# Altium schematic symbol library Linear Technology Comparators.SchLib: 630 symbols (part 4 of 16)
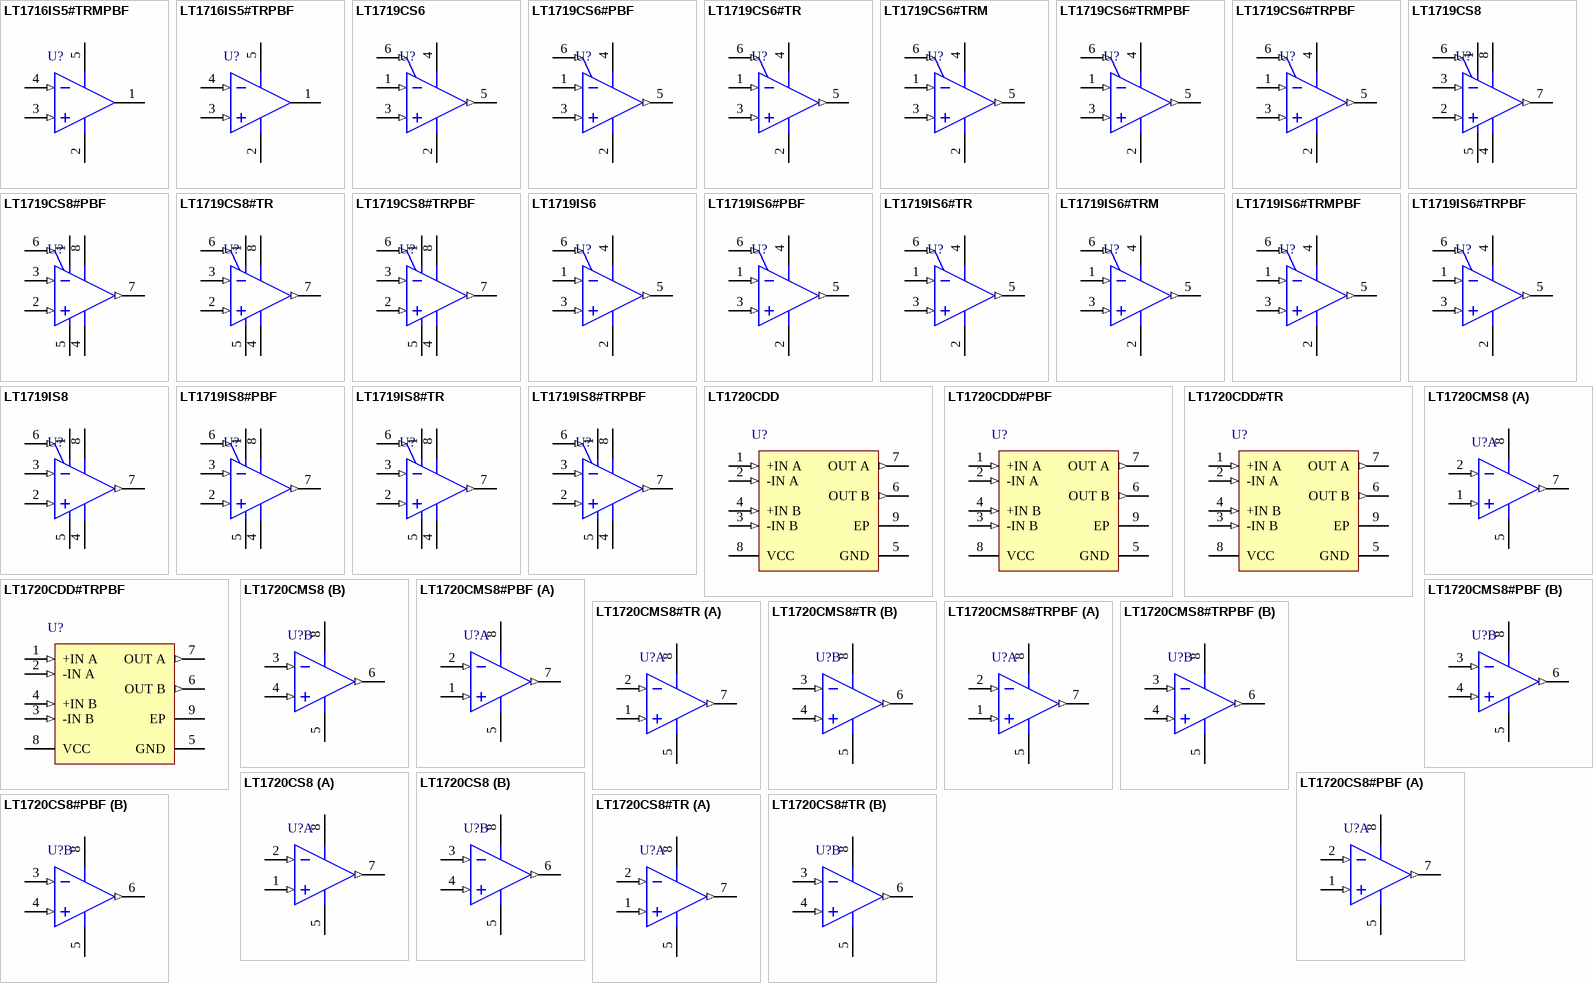
[diagram p27: symbols LT1716IS5#TRMPBF to LT1720CS8#TR]

## LT1720CMS8#TR
designator U?
4.5 ns, Single Supply 3 V / 5 V Comparator with Rail-to-Rail Outputs, 2 Channels, 2.7 to 6 V, 0 to +70 degC, 8-pin Plastic MSOP (MS8), Tape and Reel; Generic Part Number: LT1720; Manufacturer: Linear Technology; PartNumber: LT1720CMS8#TR; Channels (#): 2; Prop Delay (us): 0.0045; Supply Current (uA) Typical: 4000; Vos (mV) Guaranteed: 3; Vos (mV) Typical: 1; Vs Max (V): 6; Vs Min (V): 2.7; DatasheetVersion: Rev C; PackageReference: MS8; PackageDescription: 8-Pin Plastic MSOP, Body 3 x 3 mm, Pitch 0.65 mm; Supplier 1: Digi-Key; Supplier Part Number 1: LT1720CMS8#TR-ND; Features: Comparator, Rail-to-Rail Out; RoHS: N; Supply Voltage Range: 2.7 to 6 V; Mounting Technology: Surface Mount; ComponentLink1Description: Manufacturer URL; ComponentLink1URL: http://www.linear.com/; ComponentLink2Description: Datasheet; ComponentLink2URL: http://cds.linear.com/docs/en/datasheet/17201fc.pdf; ComponentLink3Description: Package Specification; ComponentLink3URL: http://cds.linear.com/docs/en/packaging/MSOP_8_05-08-1660.pdf
footprint LT-MS8_N (SOP, 8-Leads, Body 3x3mm, Pitch 0.65mm, IPC Medium Density)
footprint LT-MS8_L (SOP, 8-Leads, Body 3x3mm, Pitch 0.65mm, IPC High Density)
footprint LT-MS8_M (SOP, 8-Leads, Body 3x3mm, Pitch 0.65mm, IPC Low Density)
pins on every part: 5 GND (power), 8 VCC (power)
part A pins: 1 +INA (in), 2 -INA (in), 7 OUTA (out)
part B pins: 3 -INB (in), 4 +INB (in), 6 OUTB (out)

## LT1720CMS8#TRPBF
designator U?
4.5 ns, Single Supply 3 V / 5 V Comparator with Rail-to-Rail Outputs, 2 Channels, 2.7 to 6 V, 0 to +70 degC, 8-pin Plastic MSOP (MS8), Tape and Reel; Generic Part Number: LT1720; Manufacturer: Linear Technology; PartNumber: LT1720CMS8#TRPBF; Channels (#): 2; Prop Delay (us): 0.0045; Supply Current (uA) Typical: 4000; Vos (mV) Guaranteed: 3; Vos (mV) Typical: 1; Vs Max (V): 6; Vs Min (V): 2.7; DatasheetVersion: Rev C; PackageReference: MS8; PackageDescription: 8-Pin Plastic MSOP, Body 3 x 3 mm, Pitch 0.65 mm; Supplier 1: Digi-Key; Supplier Part Number 1: LT1720CMS8#TRPBF-ND; Features: Comparator, Rail-to-Rail Out; RoHS: Y; Supply Voltage Range: 2.7 to 6 V; Mounting Technology: Surface Mount; ComponentLink1Description: Manufacturer URL; ComponentLink1URL: http://www.linear.com/; ComponentLink2Description: Datasheet; ComponentLink2URL: http://cds.linear.com/docs/en/datasheet/17201fc.pdf; ComponentLink3Description: Package Specification; ComponentLink3URL: http://cds.linear.com/docs/en/packaging/MSOP_8_05-08-1660.pdf
footprint LT-MS8_N (SOP, 8-Leads, Body 3x3mm, Pitch 0.65mm, IPC Medium Density)
footprint LT-MS8_L (SOP, 8-Leads, Body 3x3mm, Pitch 0.65mm, IPC High Density)
footprint LT-MS8_M (SOP, 8-Leads, Body 3x3mm, Pitch 0.65mm, IPC Low Density)
pins on every part: 5 GND (power), 8 VCC (power)
part A pins: 1 +INA (in), 2 -INA (in), 7 OUTA (out)
part B pins: 3 -INB (in), 4 +INB (in), 6 OUTB (out)

## LT1720CS8
designator U?
4.5 ns, Single Supply 3 V / 5 V Comparator with Rail-to-Rail Outputs, 2 Channels, 2.7 to 6 V, 0 to +70 degC, 8-pin SOP (S8); Generic Part Number: LT1720; Manufacturer: Linear Technology; PartNumber: LT1720CS8; Channels (#): 2; Prop Delay (us): 0.0045; Supply Current (uA) Typical: 4000; Vos (mV) Guaranteed: 3; Vos (mV) Typical: 1; Vs Max (V): 6; Vs Min (V): 2.7; DatasheetVersion: Rev C; PackageReference: S8; PackageDescription: 8-Pin Plastic Small Outline (Narrow .150 Inch), Body 4.9 x 3.9 mm, Pitch 1.27 mm; Supplier 1: Digi-Key; Supplier Part Number 1: LT1720CS8-ND; Supplier 2: Newark; Supplier Part Number 2: 57M5826; Features: Comparator, Rail-to-Rail Out; RoHS: N; Supply Voltage Range: 2.7 to 6 V; Mounting Technology: Surface Mount; ComponentLink1Description: Manufacturer URL; ComponentLink1URL: http://www.linear.com/; ComponentLink2Description: Datasheet; ComponentLink2URL: http://cds.linear.com/docs/en/datasheet/17201fc.pdf; ComponentLink3Description: Package Specification; ComponentLink3URL: http://cds.linear.com/docs/en/packaging/05081610_G_SO8.pdf
footprint LT-S8_N (SOP, 8-Leads, Body 4.9x3.9mm, Pitch 1.27mm, IPC Medium Density)
footprint LT-S8_L (SOP, 8-Leads, Body 4.9x3.9mm, Pitch 1.27mm, IPC High Density)
footprint LT-S8_M (SOP, 8-Leads, Body 4.9x3.9mm, Pitch 1.27mm, IPC Low Density)
pins on every part: 5 GND (power), 8 VCC (power)
part A pins: 1 +INA (in), 2 -INA (in), 7 OUTA (out)
part B pins: 3 -INB (in), 4 +INB (in), 6 OUTB (out)

## LT1720CS8#PBF
designator U?
4.5 ns, Single Supply 3 V / 5 V Comparator with Rail-to-Rail Outputs, 2 Channels, 2.7 to 6 V, 0 to +70 degC, 8-pin SOP (S8); Generic Part Number: LT1720; Manufacturer: Linear Technology; PartNumber: LT1720CS8#PBF; Channels (#): 2; Prop Delay (us): 0.0045; Supply Current (uA) Typical: 4000; Vos (mV) Guaranteed: 3; Vos (mV) Typical: 1; Vs Max (V): 6; Vs Min (V): 2.7; DatasheetVersion: Rev C; PackageReference: S8; PackageDescription: 8-Pin Plastic Small Outline (Narrow .150 Inch), Body 4.9 x 3.9 mm, Pitch 1.27 mm; Supplier 1: Digi-Key; Supplier Part Number 1: LT1720CS8#PBF-ND; Supplier 2: Farnell; Supplier Part Number 2: 1651907; Supplier 3: Newark; Supplier Part Number 3: 57M5827; Features: Comparator, Rail-to-Rail Out; RoHS: Y; Supply Voltage Range: 2.7 to 6 V; Mounting Technology: Surface Mount; ComponentLink1Description: Manufacturer URL; ComponentLink1URL: http://www.linear.com/; ComponentLink2Description: Datasheet; ComponentLink2URL: http://cds.linear.com/docs/en/datasheet/17201fc.pdf; ComponentLink3Description: Package Specification; ComponentLink3URL: http://cds.linear.com/docs/en/packaging/05081610_G_SO8.pdf
footprint LT-S8_N (SOP, 8-Leads, Body 4.9x3.9mm, Pitch 1.27mm, IPC Medium Density)
footprint LT-S8_L (SOP, 8-Leads, Body 4.9x3.9mm, Pitch 1.27mm, IPC High Density)
footprint LT-S8_M (SOP, 8-Leads, Body 4.9x3.9mm, Pitch 1.27mm, IPC Low Density)
pins on every part: 5 GND (power), 8 VCC (power)
part A pins: 1 +INA (in), 2 -INA (in), 7 OUTA (out)
part B pins: 3 -INB (in), 4 +INB (in), 6 OUTB (out)

## LT1720CS8#TR
designator U?
4.5 ns, Single Supply 3 V / 5 V Comparator with Rail-to-Rail Outputs, 2 Channels, 2.7 to 6 V, 0 to +70 degC, 8-pin SOP (S8), Tape and Reel; Generic Part Number: LT1720; Manufacturer: Linear Technology; PartNumber: LT1720CS8#TR; Channels (#): 2; Prop Delay (us): 0.0045; Supply Current (uA) Typical: 4000; Vos (mV) Guaranteed: 3; Vos (mV) Typical: 1; Vs Max (V): 6; Vs Min (V): 2.7; DatasheetVersion: Rev C; PackageReference: S8; PackageDescription: 8-Pin Plastic Small Outline (Narrow .150 Inch), Body 4.9 x 3.9 mm, Pitch 1.27 mm; Supplier 1: Digi-Key; Supplier Part Number 1: LT1720CS8#TR-ND; Features: Comparator, Rail-to-Rail Out; RoHS: N; Supply Voltage Range: 2.7 to 6 V; Mounting Technology: Surface Mount; ComponentLink1Description: Manufacturer URL; ComponentLink1URL: http://www.linear.com/; ComponentLink2Description: Datasheet; ComponentLink2URL: http://cds.linear.com/docs/en/datasheet/17201fc.pdf; ComponentLink3Description: Package Specification; ComponentLink3URL: http://cds.linear.com/docs/en/packaging/05081610_G_SO8.pdf
footprint LT-S8_N (SOP, 8-Leads, Body 4.9x3.9mm, Pitch 1.27mm, IPC Medium Density)
footprint LT-S8_L (SOP, 8-Leads, Body 4.9x3.9mm, Pitch 1.27mm, IPC High Density)
footprint LT-S8_M (SOP, 8-Leads, Body 4.9x3.9mm, Pitch 1.27mm, IPC Low Density)
pins on every part: 5 GND (power), 8 VCC (power)
part A pins: 1 +INA (in), 2 -INA (in), 7 OUTA (out)
part B pins: 3 -INB (in), 4 +INB (in), 6 OUTB (out)

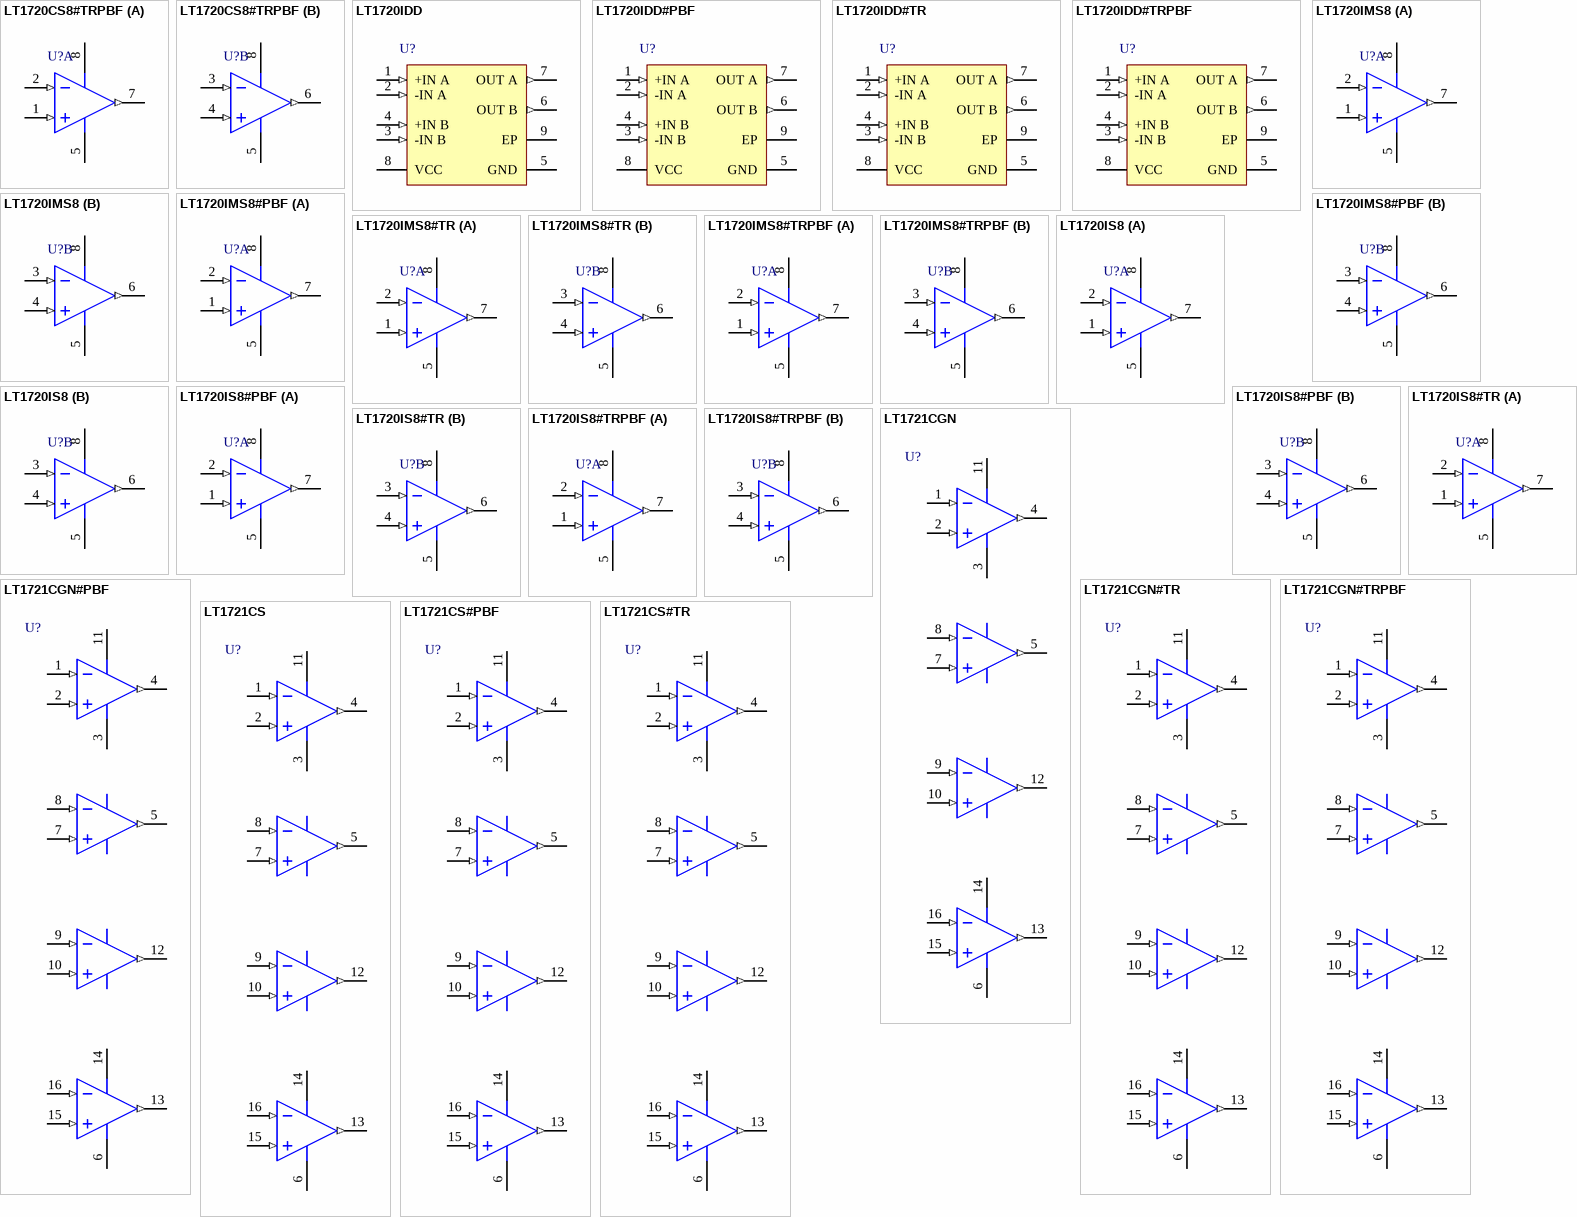
[diagram p7: symbols LT1720CS8#TRPBF to LT1721CS#TR]

## LT1720CS8#TRPBF
designator U?
4.5 ns, Single Supply 3 V / 5 V Comparator with Rail-to-Rail Outputs, 2 Channels, 2.7 to 6 V, 0 to +70 degC, 8-pin SOP (S8), Tape and Reel; Generic Part Number: LT1720; Manufacturer: Linear Technology; PartNumber: LT1720CS8#TRPBF; Channels (#): 2; Prop Delay (us): 0.0045; Supply Current (uA) Typical: 4000; Vos (mV) Guaranteed: 3; Vos (mV) Typical: 1; Vs Max (V): 6; Vs Min (V): 2.7; DatasheetVersion: Rev C; PackageReference: S8; PackageDescription: 8-Pin Plastic Small Outline (Narrow .150 Inch), Body 4.9 x 3.9 mm, Pitch 1.27 mm; Supplier 1: Digi-Key; Supplier Part Number 1: LT1720CS8#TRPBF-ND; Supplier 2: Newark; Supplier Part Number 2: 57M5829; Features: Comparator, Rail-to-Rail Out; RoHS: Y; Supply Voltage Range: 2.7 to 6 V; Mounting Technology: Surface Mount; ComponentLink1Description: Manufacturer URL; ComponentLink1URL: http://www.linear.com/; ComponentLink2Description: Datasheet; ComponentLink2URL: http://cds.linear.com/docs/en/datasheet/17201fc.pdf; ComponentLink3Description: Package Specification; ComponentLink3URL: http://cds.linear.com/docs/en/packaging/05081610_G_SO8.pdf
footprint LT-S8_N (SOP, 8-Leads, Body 4.9x3.9mm, Pitch 1.27mm, IPC Medium Density)
footprint LT-S8_L (SOP, 8-Leads, Body 4.9x3.9mm, Pitch 1.27mm, IPC High Density)
footprint LT-S8_M (SOP, 8-Leads, Body 4.9x3.9mm, Pitch 1.27mm, IPC Low Density)
pins on every part: 5 GND (power), 8 VCC (power)
part A pins: 1 +INA (in), 2 -INA (in), 7 OUTA (out)
part B pins: 3 -INB (in), 4 +INB (in), 6 OUTB (out)

## LT1720IDD
designator U?
4.5 ns, Single Supply 3 V / 5 V Comparator with Rail-to-Rail Outputs, 2 Channels, 2.7 to 6 V, -40 to +85 degC, 8-pin Plastic DFN (DD8); Generic Part Number: LT1720; Manufacturer: Linear Technology; PartNumber: LT1720IDD; Channels (#): 2; Prop Delay (us): 0.0045; Supply Current (uA) Typical: 4000; Vos (mV) Guaranteed: 3; Vos (mV) Typical: 1; Vs Max (V): 6; Vs Min (V): 2.7; DatasheetVersion: Rev C; PackageReference: DD8; PackageDescription: 8-Pin Plastic DFN, Body 3 × 3 mm, Pitch 0.5 mm; Supplier 1: Digi-Key; Supplier Part Number 1: LT1720IDD-ND; Features: Comparator, Rail-to-Rail Out; RoHS: N; Supply Voltage Range: 2.7 to 6 V; Mounting Technology: Surface Mount; Code_JEDEC: M0-229; ComponentLink1Description: Manufacturer URL; ComponentLink1URL: http://www.linear.com/; ComponentLink2Description: Datasheet; ComponentLink2URL: http://cds.linear.com/docs/en/datasheet/17201fc.pdf; ComponentLink3Description: Package Specification; ComponentLink3URL: http://cds.linear.com/docs/en/packaging/DFN_8_05-08-1698.pdf
footprint LT-DD8_V (SON, 8-Leads, Body 3x3mm, Pitch 0.5mm, Thermal Pad 2.38x1.65mm)
pins: 1 +IN A (in) "Noninverting Input of Comparator A.", 2 -IN A (in) "Inverting Input of Comparator A.", 3 -IN B (in) "Inverting Input of Comparator B.", 4 +IN B (in) "Noninverting Input of Comparator B.", 5 GND (power) "Ground.", 6 OUT B (out) "Output of Comparator B.", 7 OUT A (out) "Output of Comparator A.", 8 VCC (power) "Positive Supply Voltage.", 9 EP (power)

## LT1720IDD#PBF
designator U?
4.5 ns, Single Supply 3 V / 5 V Comparator with Rail-to-Rail Outputs, 2 Channels, 2.7 to 6 V, -40 to +85 degC, 8-pin Plastic DFN (DD8); Generic Part Number: LT1720; Manufacturer: Linear Technology; PartNumber: LT1720IDD#PBF; Channels (#): 2; Prop Delay (us): 0.0045; Supply Current (uA) Typical: 4000; Vos (mV) Guaranteed: 3; Vos (mV) Typical: 1; Vs Max (V): 6; Vs Min (V): 2.7; DatasheetVersion: Rev C; PackageReference: DD8; PackageDescription: 8-Pin Plastic DFN, Body 3 × 3 mm, Pitch 0.5 mm; Supplier 1: Digi-Key; Supplier Part Number 1: LT1720IDD#PBF-ND; Supplier 2: Farnell; Supplier Part Number 2: 2294778; Supplier 3: Newark; Supplier Part Number 3: 57M5831; Features: Comparator, Rail-to-Rail Out; RoHS: Y; Supply Voltage Range: 2.7 to 6 V; Mounting Technology: Surface Mount; Code_JEDEC: M0-229; ComponentLink1Description: Manufacturer URL; ComponentLink1URL: http://www.linear.com/; ComponentLink2Description: Datasheet; ComponentLink2URL: http://cds.linear.com/docs/en/datasheet/17201fc.pdf; ComponentLink3Description: Package Specification; ComponentLink3URL: http://cds.linear.com/docs/en/packaging/DFN_8_05-08-1698.pdf
footprint LT-DD8_V (SON, 8-Leads, Body 3x3mm, Pitch 0.5mm, Thermal Pad 2.38x1.65mm)
pins: 1 +IN A (in) "Noninverting Input of Comparator A.", 2 -IN A (in) "Inverting Input of Comparator A.", 3 -IN B (in) "Inverting Input of Comparator B.", 4 +IN B (in) "Noninverting Input of Comparator B.", 5 GND (power) "Ground.", 6 OUT B (out) "Output of Comparator B.", 7 OUT A (out) "Output of Comparator A.", 8 VCC (power) "Positive Supply Voltage.", 9 EP (power)

## LT1720IDD#TR
designator U?
4.5 ns, Single Supply 3 V / 5 V Comparator with Rail-to-Rail Outputs, 2 Channels, 2.7 to 6 V, -40 to +85 degC, 8-pin Plastic DFN (DD8), Tape and Reel; Generic Part Number: LT1720; Manufacturer: Linear Technology; PartNumber: LT1720IDD#TR; Channels (#): 2; Prop Delay (us): 0.0045; Supply Current (uA) Typical: 4000; Vos (mV) Guaranteed: 3; Vos (mV) Typical: 1; Vs Max (V): 6; Vs Min (V): 2.7; DatasheetVersion: Rev C; PackageReference: DD8; PackageDescription: 8-Pin Plastic DFN, Body 3 × 3 mm, Pitch 0.5 mm; Supplier 1: Digi-Key; Supplier Part Number 1: LT1720IDD#TR-ND; Features: Comparator, Rail-to-Rail Out; RoHS: N; Supply Voltage Range: 2.7 to 6 V; Mounting Technology: Surface Mount; Code_JEDEC: M0-229; ComponentLink1Description: Manufacturer URL; ComponentLink1URL: http://www.linear.com/; ComponentLink2Description: Datasheet; ComponentLink2URL: http://cds.linear.com/docs/en/datasheet/17201fc.pdf; ComponentLink3Description: Package Specification; ComponentLink3URL: http://cds.linear.com/docs/en/packaging/DFN_8_05-08-1698.pdf
footprint LT-DD8_V (SON, 8-Leads, Body 3x3mm, Pitch 0.5mm, Thermal Pad 2.38x1.65mm)
pins: 1 +IN A (in) "Noninverting Input of Comparator A.", 2 -IN A (in) "Inverting Input of Comparator A.", 3 -IN B (in) "Inverting Input of Comparator B.", 4 +IN B (in) "Noninverting Input of Comparator B.", 5 GND (power) "Ground.", 6 OUT B (out) "Output of Comparator B.", 7 OUT A (out) "Output of Comparator A.", 8 VCC (power) "Positive Supply Voltage.", 9 EP (power)

## LT1720IDD#TRPBF
designator U?
4.5 ns, Single Supply 3 V / 5 V Comparator with Rail-to-Rail Outputs, 2 Channels, 2.7 to 6 V, -40 to +85 degC, 8-pin Plastic DFN (DD8), Tape and Reel; Generic Part Number: LT1720; Manufacturer: Linear Technology; PartNumber: LT1720IDD#TRPBF; Channels (#): 2; Prop Delay (us): 0.0045; Supply Current (uA) Typical: 4000; Vos (mV) Guaranteed: 3; Vos (mV) Typical: 1; Vs Max (V): 6; Vs Min (V): 2.7; DatasheetVersion: Rev C; PackageReference: DD8; PackageDescription: 8-Pin Plastic DFN, Body 3 × 3 mm, Pitch 0.5 mm; Supplier 1: Digi-Key; Supplier Part Number 1: LT1720IDD#TRPBF-ND; Features: Comparator, Rail-to-Rail Out; RoHS: Y; Supply Voltage Range: 2.7 to 6 V; Mounting Technology: Surface Mount; Code_JEDEC: M0-229; ComponentLink1Description: Manufacturer URL; ComponentLink1URL: http://www.linear.com/; ComponentLink2Description: Datasheet; ComponentLink2URL: http://cds.linear.com/docs/en/datasheet/17201fc.pdf; ComponentLink3Description: Package Specification; ComponentLink3URL: http://cds.linear.com/docs/en/packaging/DFN_8_05-08-1698.pdf
footprint LT-DD8_V (SON, 8-Leads, Body 3x3mm, Pitch 0.5mm, Thermal Pad 2.38x1.65mm)
pins: 1 +IN A (in) "Noninverting Input of Comparator A.", 2 -IN A (in) "Inverting Input of Comparator A.", 3 -IN B (in) "Inverting Input of Comparator B.", 4 +IN B (in) "Noninverting Input of Comparator B.", 5 GND (power) "Ground.", 6 OUT B (out) "Output of Comparator B.", 7 OUT A (out) "Output of Comparator A.", 8 VCC (power) "Positive Supply Voltage.", 9 EP (power)

## LT1720IMS8
designator U?
4.5 ns, Single Supply 3 V / 5 V Comparator with Rail-to-Rail Outputs, 2 Channels, 2.7 to 6 V, -40 to +85 degC, 8-pin Plastic MSOP (MS8); Generic Part Number: LT1720; Manufacturer: Linear Technology; PartNumber: LT1720IMS8; Channels (#): 2; Prop Delay (us): 0.0045; Supply Current (uA) Typical: 4000; Vos (mV) Guaranteed: 3; Vos (mV) Typical: 1; Vs Max (V): 6; Vs Min (V): 2.7; DatasheetVersion: Rev C; PackageReference: MS8; PackageDescription: 8-Pin Plastic MSOP, Body 3 x 3 mm, Pitch 0.65 mm; Supplier 1: Digi-Key; Supplier Part Number 1: LT1720IMS8-ND; Features: Comparator, Rail-to-Rail Out; RoHS: N; Supply Voltage Range: 2.7 to 6 V; Mounting Technology: Surface Mount; ComponentLink1Description: Manufacturer URL; ComponentLink1URL: http://www.linear.com/; ComponentLink2Description: Datasheet; ComponentLink2URL: http://cds.linear.com/docs/en/datasheet/17201fc.pdf; ComponentLink3Description: Package Specification; ComponentLink3URL: http://cds.linear.com/docs/en/packaging/MSOP_8_05-08-1660.pdf
footprint LT-MS8_N (SOP, 8-Leads, Body 3x3mm, Pitch 0.65mm, IPC Medium Density)
footprint LT-MS8_L (SOP, 8-Leads, Body 3x3mm, Pitch 0.65mm, IPC High Density)
footprint LT-MS8_M (SOP, 8-Leads, Body 3x3mm, Pitch 0.65mm, IPC Low Density)
pins on every part: 5 GND (power), 8 VCC (power)
part A pins: 1 +INA (in), 2 -INA (in), 7 OUTA (out)
part B pins: 3 -INB (in), 4 +INB (in), 6 OUTB (out)

## LT1720IMS8#PBF
designator U?
4.5 ns, Single Supply 3 V / 5 V Comparator with Rail-to-Rail Outputs, 2 Channels, 2.7 to 6 V, -40 to +85 degC, 8-pin Plastic MSOP (MS8); Generic Part Number: LT1720; Manufacturer: Linear Technology; PartNumber: LT1720IMS8#PBF; Channels (#): 2; Prop Delay (us): 0.0045; Supply Current (uA) Typical: 4000; Vos (mV) Guaranteed: 3; Vos (mV) Typical: 1; Vs Max (V): 6; Vs Min (V): 2.7; DatasheetVersion: Rev C; PackageReference: MS8; PackageDescription: 8-Pin Plastic MSOP, Body 3 x 3 mm, Pitch 0.65 mm; Supplier 1: Digi-Key; Supplier Part Number 1: LT1720IMS8#PBF-ND; Supplier 2: Newark; Supplier Part Number 2: 57M5835; Features: Comparator, Rail-to-Rail Out; RoHS: Y; Supply Voltage Range: 2.7 to 6 V; Mounting Technology: Surface Mount; ComponentLink1Description: Manufacturer URL; ComponentLink1URL: http://www.linear.com/; ComponentLink2Description: Datasheet; ComponentLink2URL: http://cds.linear.com/docs/en/datasheet/17201fc.pdf; ComponentLink3Description: Package Specification; ComponentLink3URL: http://cds.linear.com/docs/en/packaging/MSOP_8_05-08-1660.pdf
footprint LT-MS8_N (SOP, 8-Leads, Body 3x3mm, Pitch 0.65mm, IPC Medium Density)
footprint LT-MS8_L (SOP, 8-Leads, Body 3x3mm, Pitch 0.65mm, IPC High Density)
footprint LT-MS8_M (SOP, 8-Leads, Body 3x3mm, Pitch 0.65mm, IPC Low Density)
pins on every part: 5 GND (power), 8 VCC (power)
part A pins: 1 +INA (in), 2 -INA (in), 7 OUTA (out)
part B pins: 3 -INB (in), 4 +INB (in), 6 OUTB (out)

## LT1720IMS8#TR
designator U?
4.5 ns, Single Supply 3 V / 5 V Comparator with Rail-to-Rail Outputs, 2 Channels, 2.7 to 6 V, -40 to +85 degC, 8-pin Plastic MSOP (MS8), Tape and Reel; Generic Part Number: LT1720; Manufacturer: Linear Technology; PartNumber: LT1720IMS8#TR; Channels (#): 2; Prop Delay (us): 0.0045; Supply Current (uA) Typical: 4000; Vos (mV) Guaranteed: 3; Vos (mV) Typical: 1; Vs Max (V): 6; Vs Min (V): 2.7; DatasheetVersion: Rev C; PackageReference: MS8; PackageDescription: 8-Pin Plastic MSOP, Body 3 x 3 mm, Pitch 0.65 mm; Supplier 1: Digi-Key; Supplier Part Number 1: LT1720IMS8#TR-ND; Features: Comparator, Rail-to-Rail Out; RoHS: N; Supply Voltage Range: 2.7 to 6 V; Mounting Technology: Surface Mount; ComponentLink1Description: Manufacturer URL; ComponentLink1URL: http://www.linear.com/; ComponentLink2Description: Datasheet; ComponentLink2URL: http://cds.linear.com/docs/en/datasheet/17201fc.pdf; ComponentLink3Description: Package Specification; ComponentLink3URL: http://cds.linear.com/docs/en/packaging/MSOP_8_05-08-1660.pdf
footprint LT-MS8_N (SOP, 8-Leads, Body 3x3mm, Pitch 0.65mm, IPC Medium Density)
footprint LT-MS8_L (SOP, 8-Leads, Body 3x3mm, Pitch 0.65mm, IPC High Density)
footprint LT-MS8_M (SOP, 8-Leads, Body 3x3mm, Pitch 0.65mm, IPC Low Density)
pins on every part: 5 GND (power), 8 VCC (power)
part A pins: 1 +INA (in), 2 -INA (in), 7 OUTA (out)
part B pins: 3 -INB (in), 4 +INB (in), 6 OUTB (out)

## LT1720IMS8#TRPBF
designator U?
4.5 ns, Single Supply 3 V / 5 V Comparator with Rail-to-Rail Outputs, 2 Channels, 2.7 to 6 V, -40 to +85 degC, 8-pin Plastic MSOP (MS8), Tape and Reel; Generic Part Number: LT1720; Manufacturer: Linear Technology; PartNumber: LT1720IMS8#TRPBF; Channels (#): 2; Prop Delay (us): 0.0045; Supply Current (uA) Typical: 4000; Vos (mV) Guaranteed: 3; Vos (mV) Typical: 1; Vs Max (V): 6; Vs Min (V): 2.7; DatasheetVersion: Rev C; PackageReference: MS8; PackageDescription: 8-Pin Plastic MSOP, Body 3 x 3 mm, Pitch 0.65 mm; Supplier 1: Digi-Key; Supplier Part Number 1: LT1720IMS8#TRPBF-ND; Supplier 2: Newark; Supplier Part Number 2: 57M5837; Features: Comparator, Rail-to-Rail Out; RoHS: Y; Supply Voltage Range: 2.7 to 6 V; Mounting Technology: Surface Mount; ComponentLink1Description: Manufacturer URL; ComponentLink1URL: http://www.linear.com/; ComponentLink2Description: Datasheet; ComponentLink2URL: http://cds.linear.com/docs/en/datasheet/17201fc.pdf; ComponentLink3Description: Package Specification; ComponentLink3URL: http://cds.linear.com/docs/en/packaging/MSOP_8_05-08-1660.pdf
footprint LT-MS8_N (SOP, 8-Leads, Body 3x3mm, Pitch 0.65mm, IPC Medium Density)
footprint LT-MS8_L (SOP, 8-Leads, Body 3x3mm, Pitch 0.65mm, IPC High Density)
footprint LT-MS8_M (SOP, 8-Leads, Body 3x3mm, Pitch 0.65mm, IPC Low Density)
pins on every part: 5 GND (power), 8 VCC (power)
part A pins: 1 +INA (in), 2 -INA (in), 7 OUTA (out)
part B pins: 3 -INB (in), 4 +INB (in), 6 OUTB (out)

## LT1720IS8
designator U?
4.5 ns, Single Supply 3 V / 5 V Comparator with Rail-to-Rail Outputs, 2 Channels, 2.7 to 6 V, -40 to +85 degC, 8-pin SOP (S8); Generic Part Number: LT1720; Manufacturer: Linear Technology; PartNumber: LT1720IS8; Channels (#): 2; Prop Delay (us): 0.0045; Supply Current (uA) Typical: 4000; Vos (mV) Guaranteed: 3; Vos (mV) Typical: 1; Vs Max (V): 6; Vs Min (V): 2.7; DatasheetVersion: Rev C; PackageReference: S8; PackageDescription: 8-Pin Plastic Small Outline (Narrow .150 Inch), Body 4.9 x 3.9 mm, Pitch 1.27 mm; Supplier 1: Digi-Key; Supplier Part Number 1: LT1720IS8-ND; Supplier 2: Newark; Supplier Part Number 2: 57M5838; Features: Comparator, Rail-to-Rail Out; RoHS: N; Supply Voltage Range: 2.7 to 6 V; Mounting Technology: Surface Mount; ComponentLink1Description: Manufacturer URL; ComponentLink1URL: http://www.linear.com/; ComponentLink2Description: Datasheet; ComponentLink2URL: http://cds.linear.com/docs/en/datasheet/17201fc.pdf; ComponentLink3Description: Package Specification; ComponentLink3URL: http://cds.linear.com/docs/en/packaging/05081610_G_SO8.pdf
footprint LT-S8_N (SOP, 8-Leads, Body 4.9x3.9mm, Pitch 1.27mm, IPC Medium Density)
footprint LT-S8_L (SOP, 8-Leads, Body 4.9x3.9mm, Pitch 1.27mm, IPC High Density)
footprint LT-S8_M (SOP, 8-Leads, Body 4.9x3.9mm, Pitch 1.27mm, IPC Low Density)
pins on every part: 5 GND (power), 8 VCC (power)
part A pins: 1 +INA (in), 2 -INA (in), 7 OUTA (out)
part B pins: 3 -INB (in), 4 +INB (in), 6 OUTB (out)

## LT1720IS8#PBF
designator U?
4.5 ns, Single Supply 3 V / 5 V Comparator with Rail-to-Rail Outputs, 2 Channels, 2.7 to 6 V, -40 to +85 degC, 8-pin SOP (S8); Generic Part Number: LT1720; Manufacturer: Linear Technology; PartNumber: LT1720IS8#PBF; Channels (#): 2; Prop Delay (us): 0.0045; Supply Current (uA) Typical: 4000; Vos (mV) Guaranteed: 3; Vos (mV) Typical: 1; Vs Max (V): 6; Vs Min (V): 2.7; DatasheetVersion: Rev C; PackageReference: S8; PackageDescription: 8-Pin Plastic Small Outline (Narrow .150 Inch), Body 4.9 x 3.9 mm, Pitch 1.27 mm; Supplier 1: Digi-Key; Supplier Part Number 1: LT1720IS8#PBF-ND; Supplier 2: Farnell; Supplier Part Number 2: 2254829; Supplier 3: Newark; Supplier Part Number 3: 57M5839; Features: Comparator, Rail-to-Rail Out; RoHS: Y; Supply Voltage Range: 2.7 to 6 V; Mounting Technology: Surface Mount; ComponentLink1Description: Manufacturer URL; ComponentLink1URL: http://www.linear.com/; ComponentLink2Description: Datasheet; ComponentLink2URL: http://cds.linear.com/docs/en/datasheet/17201fc.pdf; ComponentLink3Description: Package Specification; ComponentLink3URL: http://cds.linear.com/docs/en/packaging/05081610_G_SO8.pdf
footprint LT-S8_N (SOP, 8-Leads, Body 4.9x3.9mm, Pitch 1.27mm, IPC Medium Density)
footprint LT-S8_L (SOP, 8-Leads, Body 4.9x3.9mm, Pitch 1.27mm, IPC High Density)
footprint LT-S8_M (SOP, 8-Leads, Body 4.9x3.9mm, Pitch 1.27mm, IPC Low Density)
pins on every part: 5 GND (power), 8 VCC (power)
part A pins: 1 +INA (in), 2 -INA (in), 7 OUTA (out)
part B pins: 3 -INB (in), 4 +INB (in), 6 OUTB (out)

## LT1720IS8#TR
designator U?
4.5 ns, Single Supply 3 V / 5 V Comparator with Rail-to-Rail Outputs, 2 Channels, 2.7 to 6 V, -40 to +85 degC, 8-pin SOP (S8), Tape and Reel; Generic Part Number: LT1720; Manufacturer: Linear Technology; PartNumber: LT1720IS8#TR; Channels (#): 2; Prop Delay (us): 0.0045; Supply Current (uA) Typical: 4000; Vos (mV) Guaranteed: 3; Vos (mV) Typical: 1; Vs Max (V): 6; Vs Min (V): 2.7; DatasheetVersion: Rev C; PackageReference: S8; PackageDescription: 8-Pin Plastic Small Outline (Narrow .150 Inch), Body 4.9 x 3.9 mm, Pitch 1.27 mm; Supplier 1: Digi-Key; Supplier Part Number 1: LT1720IS8#TR-ND; Supplier 2: Newark; Supplier Part Number 2: 57M5840; Features: Comparator, Rail-to-Rail Out; RoHS: N; Supply Voltage Range: 2.7 to 6 V; Mounting Technology: Surface Mount; ComponentLink1Description: Manufacturer URL; ComponentLink1URL: http://www.linear.com/; ComponentLink2Description: Datasheet; ComponentLink2URL: http://cds.linear.com/docs/en/datasheet/17201fc.pdf; ComponentLink3Description: Package Specification; ComponentLink3URL: http://cds.linear.com/docs/en/packaging/05081610_G_SO8.pdf
footprint LT-S8_N (SOP, 8-Leads, Body 4.9x3.9mm, Pitch 1.27mm, IPC Medium Density)
footprint LT-S8_L (SOP, 8-Leads, Body 4.9x3.9mm, Pitch 1.27mm, IPC High Density)
footprint LT-S8_M (SOP, 8-Leads, Body 4.9x3.9mm, Pitch 1.27mm, IPC Low Density)
pins on every part: 5 GND (power), 8 VCC (power)
part A pins: 1 +INA (in), 2 -INA (in), 7 OUTA (out)
part B pins: 3 -INB (in), 4 +INB (in), 6 OUTB (out)

## LT1720IS8#TRPBF
designator U?
4.5 ns, Single Supply 3 V / 5 V Comparator with Rail-to-Rail Outputs, 2 Channels, 2.7 to 6 V, -40 to +85 degC, 8-pin SOP (S8), Tape and Reel; Generic Part Number: LT1720; Manufacturer: Linear Technology; PartNumber: LT1720IS8#TRPBF; Channels (#): 2; Prop Delay (us): 0.0045; Supply Current (uA) Typical: 4000; Vos (mV) Guaranteed: 3; Vos (mV) Typical: 1; Vs Max (V): 6; Vs Min (V): 2.7; DatasheetVersion: Rev C; PackageReference: S8; PackageDescription: 8-Pin Plastic Small Outline (Narrow .150 Inch), Body 4.9 x 3.9 mm, Pitch 1.27 mm; Supplier 1: Digi-Key; Supplier Part Number 1: LT1720IS8#TRPBF-ND; Supplier 2: Newark; Supplier Part Number 2: 57M5841; Features: Comparator, Rail-to-Rail Out; RoHS: Y; Supply Voltage Range: 2.7 to 6 V; Mounting Technology: Surface Mount; ComponentLink1Description: Manufacturer URL; ComponentLink1URL: http://www.linear.com/; ComponentLink2Description: Datasheet; ComponentLink2URL: http://cds.linear.com/docs/en/datasheet/17201fc.pdf; ComponentLink3Description: Package Specification; ComponentLink3URL: http://cds.linear.com/docs/en/packaging/05081610_G_SO8.pdf
footprint LT-S8_N (SOP, 8-Leads, Body 4.9x3.9mm, Pitch 1.27mm, IPC Medium Density)
footprint LT-S8_L (SOP, 8-Leads, Body 4.9x3.9mm, Pitch 1.27mm, IPC High Density)
footprint LT-S8_M (SOP, 8-Leads, Body 4.9x3.9mm, Pitch 1.27mm, IPC Low Density)
pins on every part: 5 GND (power), 8 VCC (power)
part A pins: 1 +INA (in), 2 -INA (in), 7 OUTA (out)
part B pins: 3 -INB (in), 4 +INB (in), 6 OUTB (out)

## LT1721CGN
designator U?
4.5 ns, Single Supply 3 V / 5 V Comparator with Rail-to-Rail Outputs, 4 Channels, 2.7 to 6 V, 0 to +70 degC, 16-pin Plastic SSOP (GN16); Generic Part Number: LT1721; Manufacturer: Linear Technology; PartNumber: LT1721CGN; Channels (#): 4; Prop Delay (us): 0.0045; Supply Current (uA) Typical: 4000; Vos (mV) Guaranteed: 3; Vos (mV) Typical: 1; Vs Max (V): 6; Vs Min (V): 2.7; DatasheetVersion: Rev C; PackageReference: GN16; PackageDescription: 16-Pin Plastic SSOP, Body 4.89 x 3.9 mm, Pitch 0.635 mm; Supplier 1: Digi-Key; Supplier Part Number 1: LT1721CGN-ND; Features: Comparator, Rail-to-Rail Out; RoHS: N; Supply Voltage Range: 2.7 to 6 V; Mounting Technology: Surface Mount; ComponentLink1Description: Manufacturer URL; ComponentLink1URL: http://www.linear.com/; ComponentLink2Description: Datasheet; ComponentLink2URL: http://cds.linear.com/docs/en/datasheet/17201fc.pdf; ComponentLink3Description: Package Specification; ComponentLink3URL: http://cds.linear.com/docs/en/packaging/05081641_B_GN16.pdf
footprint LT-GN16_N (SOP, 16-Leads, Body 4.89x3.9mm, Pitch 0.635mm, , IPC Medium Density)
footprint LT-GN16_L (SOP, 16-Leads, Body 4.89x3.9mm, Pitch 0.635mm, , IPC High Density)
footprint LT-GN16_M (SOP, 16-Leads, Body 4.89x3.9mm, Pitch 0.635mm, , IPC Low Density)
pins: 1 -INA (in), 2 +INA (in), 3 GND (power), 4 OUTA (out), 5 OUTB (out), 6 GND (power), 7 +INB (in), 8 -INB (in), 9 -INC (in), 10 +INC (in), 11 VCC (power), 12 OUTC (out), 13 OUTD (out), 14 VCC (power), 15 +IND (in), 16 -IND (in)

## LT1721CGN#PBF
designator U?
4.5 ns, Single Supply 3 V / 5 V Comparator with Rail-to-Rail Outputs, 4 Channels, 2.7 to 6 V, 0 to +70 degC, 16-pin Plastic SSOP (GN16); Generic Part Number: LT1721; Manufacturer: Linear Technology; PartNumber: LT1721CGN#PBF; Channels (#): 4; Prop Delay (us): 0.0045; Supply Current (uA) Typical: 4000; Vos (mV) Guaranteed: 3; Vos (mV) Typical: 1; Vs Max (V): 6; Vs Min (V): 2.7; DatasheetVersion: Rev C; PackageReference: GN16; PackageDescription: 16-Pin Plastic SSOP, Body 4.89 x 3.9 mm, Pitch 0.635 mm; Supplier 1: Digi-Key; Supplier Part Number 1: LT1721CGN#PBF-ND; Supplier 2: Farnell; Supplier Part Number 2: 1663475; Supplier 3: Newark; Supplier Part Number 3: 57M5843; Features: Comparator, Rail-to-Rail Out; RoHS: Y; Supply Voltage Range: 2.7 to 6 V; Mounting Technology: Surface Mount; ComponentLink1Description: Manufacturer URL; ComponentLink1URL: http://www.linear.com/; ComponentLink2Description: Datasheet; ComponentLink2URL: http://cds.linear.com/docs/en/datasheet/17201fc.pdf; ComponentLink3Description: Package Specification; ComponentLink3URL: http://cds.linear.com/docs/en/packaging/05081641_B_GN16.pdf
footprint LT-GN16_N (SOP, 16-Leads, Body 4.89x3.9mm, Pitch 0.635mm, , IPC Medium Density)
footprint LT-GN16_L (SOP, 16-Leads, Body 4.89x3.9mm, Pitch 0.635mm, , IPC High Density)
footprint LT-GN16_M (SOP, 16-Leads, Body 4.89x3.9mm, Pitch 0.635mm, , IPC Low Density)
pins: 1 -INA (in), 2 +INA (in), 3 GND (power), 4 OUTA (out), 5 OUTB (out), 6 GND (power), 7 +INB (in), 8 -INB (in), 9 -INC (in), 10 +INC (in), 11 VCC (power), 12 OUTC (out), 13 OUTD (out), 14 VCC (power), 15 +IND (in), 16 -IND (in)

## LT1721CGN#TR
designator U?
4.5 ns, Single Supply 3 V / 5 V Comparator with Rail-to-Rail Outputs, 4 Channels, 2.7 to 6 V, 0 to +70 degC, 16-pin Plastic SSOP (GN16), Tape and Reel; Generic Part Number: LT1721; Manufacturer: Linear Technology; PartNumber: LT1721CGN#TR; Channels (#): 4; Prop Delay (us): 0.0045; Supply Current (uA) Typical: 4000; Vos (mV) Guaranteed: 3; Vos (mV) Typical: 1; Vs Max (V): 6; Vs Min (V): 2.7; DatasheetVersion: Rev C; PackageReference: GN16; PackageDescription: 16-Pin Plastic SSOP, Body 4.89 x 3.9 mm, Pitch 0.635 mm; Supplier 1: Digi-Key; Supplier Part Number 1: LT1721CGN#TR-ND; Features: Comparator, Rail-to-Rail Out; RoHS: N; Supply Voltage Range: 2.7 to 6 V; Mounting Technology: Surface Mount; ComponentLink1Description: Manufacturer URL; ComponentLink1URL: http://www.linear.com/; ComponentLink2Description: Datasheet; ComponentLink2URL: http://cds.linear.com/docs/en/datasheet/17201fc.pdf; ComponentLink3Description: Package Specification; ComponentLink3URL: http://cds.linear.com/docs/en/packaging/05081641_B_GN16.pdf
footprint LT-GN16_N (SOP, 16-Leads, Body 4.89x3.9mm, Pitch 0.635mm, , IPC Medium Density)
footprint LT-GN16_L (SOP, 16-Leads, Body 4.89x3.9mm, Pitch 0.635mm, , IPC High Density)
footprint LT-GN16_M (SOP, 16-Leads, Body 4.89x3.9mm, Pitch 0.635mm, , IPC Low Density)
pins: 1 -INA (in), 2 +INA (in), 3 GND (power), 4 OUTA (out), 5 OUTB (out), 6 GND (power), 7 +INB (in), 8 -INB (in), 9 -INC (in), 10 +INC (in), 11 VCC (power), 12 OUTC (out), 13 OUTD (out), 14 VCC (power), 15 +IND (in), 16 -IND (in)

## LT1721CGN#TRPBF
designator U?
4.5 ns, Single Supply 3 V / 5 V Comparator with Rail-to-Rail Outputs, 4 Channels, 2.7 to 6 V, 0 to +70 degC, 16-pin Plastic SSOP (GN16), Tape and Reel; Generic Part Number: LT1721; Manufacturer: Linear Technology; PartNumber: LT1721CGN#TRPBF; Channels (#): 4; Prop Delay (us): 0.0045; Supply Current (uA) Typical: 4000; Vos (mV) Guaranteed: 3; Vos (mV) Typical: 1; Vs Max (V): 6; Vs Min (V): 2.7; DatasheetVersion: Rev C; PackageReference: GN16; PackageDescription: 16-Pin Plastic SSOP, Body 4.89 x 3.9 mm, Pitch 0.635 mm; Supplier 1: Digi-Key; Supplier Part Number 1: LT1721CGN#TRPBF-ND; Supplier 2: Newark; Supplier Part Number 2: 57M5845; Features: Comparator, Rail-to-Rail Out; RoHS: Y; Supply Voltage Range: 2.7 to 6 V; Mounting Technology: Surface Mount; ComponentLink1Description: Manufacturer URL; ComponentLink1URL: http://www.linear.com/; ComponentLink2Description: Datasheet; ComponentLink2URL: http://cds.linear.com/docs/en/datasheet/17201fc.pdf; ComponentLink3Description: Package Specification; ComponentLink3URL: http://cds.linear.com/docs/en/packaging/05081641_B_GN16.pdf
footprint LT-GN16_N (SOP, 16-Leads, Body 4.89x3.9mm, Pitch 0.635mm, , IPC Medium Density)
footprint LT-GN16_L (SOP, 16-Leads, Body 4.89x3.9mm, Pitch 0.635mm, , IPC High Density)
footprint LT-GN16_M (SOP, 16-Leads, Body 4.89x3.9mm, Pitch 0.635mm, , IPC Low Density)
pins: 1 -INA (in), 2 +INA (in), 3 GND (power), 4 OUTA (out), 5 OUTB (out), 6 GND (power), 7 +INB (in), 8 -INB (in), 9 -INC (in), 10 +INC (in), 11 VCC (power), 12 OUTC (out), 13 OUTD (out), 14 VCC (power), 15 +IND (in), 16 -IND (in)

## LT1721CS
designator U?
4.5 ns, Single Supply 3 V / 5 V Comparator with Rail-to-Rail Outputs, 4 Channels, 2.7 to 6 V, 0 to +70 degC, 16-pin SOP (S16); Generic Part Number: LT1721; Manufacturer: Linear Technology; PartNumber: LT1721CS; Channels (#): 4; Prop Delay (us): 0.0045; Supply Current (uA) Typical: 4000; Vos (mV) Guaranteed: 3; Vos (mV) Typical: 1; Vs Max (V): 6; Vs Min (V): 2.7; DatasheetVersion: Rev C; PackageReference: S16; PackageDescription: 16-Pin Plastic Small Outline, Body 9.91 x 3.9 mm, Pitch 1.27 mm; Supplier 1: Digi-Key; Supplier Part Number 1: LT1721CS-ND; Features: Comparator, Rail-to-Rail Out; RoHS: N; Supply Voltage Range: 2.7 to 6 V; Mounting Technology: Surface Mount; ComponentLink1Description: Manufacturer URL; ComponentLink1URL: http://www.linear.com/; ComponentLink2Description: Datasheet; ComponentLink2URL: http://cds.linear.com/docs/en/datasheet/17201fc.pdf; ComponentLink3Description: Package Specification; ComponentLink3URL: http://cds.linear.com/docs/en/packaging/05081610_G_S14.pdf
footprint LT-S16_N (SOIC, 16-Leads, Body 9.9x3.9mm, Pitch 1.27mm, IPC Medium Density)
footprint LT-S16_L (SOIC, 16-Leads, Body 9.9x3.9mm, Pitch 1.27mm, IPC High Density)
footprint LT-S16_M (SOIC, 16-Leads, Body 9.9x3.9mm, Pitch 1.27mm, IPC Low Density)
pins: 1 -INA (in), 2 +INA (in), 3 GND (power), 4 OUTA (out), 5 OUTB (out), 6 GND (power), 7 +INB (in), 8 -INB (in), 9 -INC (in), 10 +INC (in), 11 VCC (power), 12 OUTC (out), 13 OUTD (out), 14 VCC (power), 15 +IND (in), 16 -IND (in)

## LT1721CS#PBF
designator U?
Quad, 4.5 ns, Single Supply 3 V / 5 V Comparator with Rail-to-Rail Outputs, 4 Channels, 2.7 to 6 V, 0 to +70 degC, 16-pin SOP (S16); Generic Part Number: LT1721; Manufacturer: Linear Technology; PartNumber: LT1721CS#PBF; Channels (#): 4; Prop Delay (us): 0.0045; Supply Current (uA) Typical: 4000; Vos (mV) Guaranteed: 3; Vos (mV) Typical: 1; Vs Max (V): 6; Vs Min (V): 2.7; DatasheetVersion: Rev C; PackageReference: S16; PackageDescription: 16-Pin Plastic Small Outline, Body 9.91 x 3.9 mm, Pitch 1.27 mm; Supplier 1: Digi-Key; Supplier Part Number 1: LT1721CS#PBF-ND; Supplier 2: Farnell; Supplier Part Number 2: 1663476; Supplier 3: Newark; Supplier Part Number 3: 57M5847; Features: Comparator, Rail-to-Rail Out; RoHS: Y; Supply Voltage Range: 2.7 to 6 V; Mounting Technology: Surface Mount; ComponentLink1Description: Manufacturer URL; ComponentLink1URL: http://www.linear.com/; ComponentLink2Description: Datasheet; ComponentLink2URL: http://cds.linear.com/docs/en/datasheet/17201fc.pdf; ComponentLink3Description: Package Specification; ComponentLink3URL: http://cds.linear.com/docs/en/packaging/05081610_G_S14.pdf
footprint LT-S16_N (SOIC, 16-Leads, Body 9.9x3.9mm, Pitch 1.27mm, IPC Medium Density)
footprint LT-S16_L (SOIC, 16-Leads, Body 9.9x3.9mm, Pitch 1.27mm, IPC High Density)
footprint LT-S16_M (SOIC, 16-Leads, Body 9.9x3.9mm, Pitch 1.27mm, IPC Low Density)
pins: 1 -INA (in), 2 +INA (in), 3 GND (power), 4 OUTA (out), 5 OUTB (out), 6 GND (power), 7 +INB (in), 8 -INB (in), 9 -INC (in), 10 +INC (in), 11 VCC (power), 12 OUTC (out), 13 OUTD (out), 14 VCC (power), 15 +IND (in), 16 -IND (in)

## LT1721CS#TR
designator U?
Quad, 4.5 ns, Single Supply 3 V / 5 V Comparator with Rail-to-Rail Outputs, 4 Channels, 2.7 to 6 V, 0 to +70 degC, 16-pin SOP (S16), Tape and Reel; Generic Part Number: LT1721; Manufacturer: Linear Technology; PartNumber: LT1721CS#TR; Channels (#): 4; Prop Delay (us): 0.0045; Supply Current (uA) Typical: 4000; Vos (mV) Guaranteed: 3; Vos (mV) Typical: 1; Vs Max (V): 6; Vs Min (V): 2.7; DatasheetVersion: Rev C; PackageReference: S16; PackageDescription: 16-Pin Plastic Small Outline, Body 9.91 x 3.9 mm, Pitch 1.27 mm; Supplier 1: Digi-Key; Supplier Part Number 1: LT1721CS#TR-ND; Features: Comparator, Rail-to-Rail Out; RoHS: N; Supply Voltage Range: 2.7 to 6 V; Mounting Technology: Surface Mount; ComponentLink1Description: Manufacturer URL; ComponentLink1URL: http://www.linear.com/; ComponentLink2Description: Datasheet; ComponentLink2URL: http://cds.linear.com/docs/en/datasheet/17201fc.pdf; ComponentLink3Description: Package Specification; ComponentLink3URL: http://cds.linear.com/docs/en/packaging/05081610_G_S14.pdf
footprint LT-S16_N (SOIC, 16-Leads, Body 9.9x3.9mm, Pitch 1.27mm, IPC Medium Density)
footprint LT-S16_L (SOIC, 16-Leads, Body 9.9x3.9mm, Pitch 1.27mm, IPC High Density)
footprint LT-S16_M (SOIC, 16-Leads, Body 9.9x3.9mm, Pitch 1.27mm, IPC Low Density)
pins: 1 -INA (in), 2 +INA (in), 3 GND (power), 4 OUTA (out), 5 OUTB (out), 6 GND (power), 7 +INB (in), 8 -INB (in), 9 -INC (in), 10 +INC (in), 11 VCC (power), 12 OUTC (out), 13 OUTD (out), 14 VCC (power), 15 +IND (in), 16 -IND (in)
